# Altium footprint library mobinbyn-Module.PcbLib: 93 footprints (part 5 of 6)
Each footprint in its own frame and in the unit in brackets; x right, y up, seen from the top. Pads: shape width x height; smd on the part's side, far side on the other; paste and mask are expansions set on the pad; w line width, h text height; cw(c..) or ccw(c..) is an arc to the next point about the centre after c.
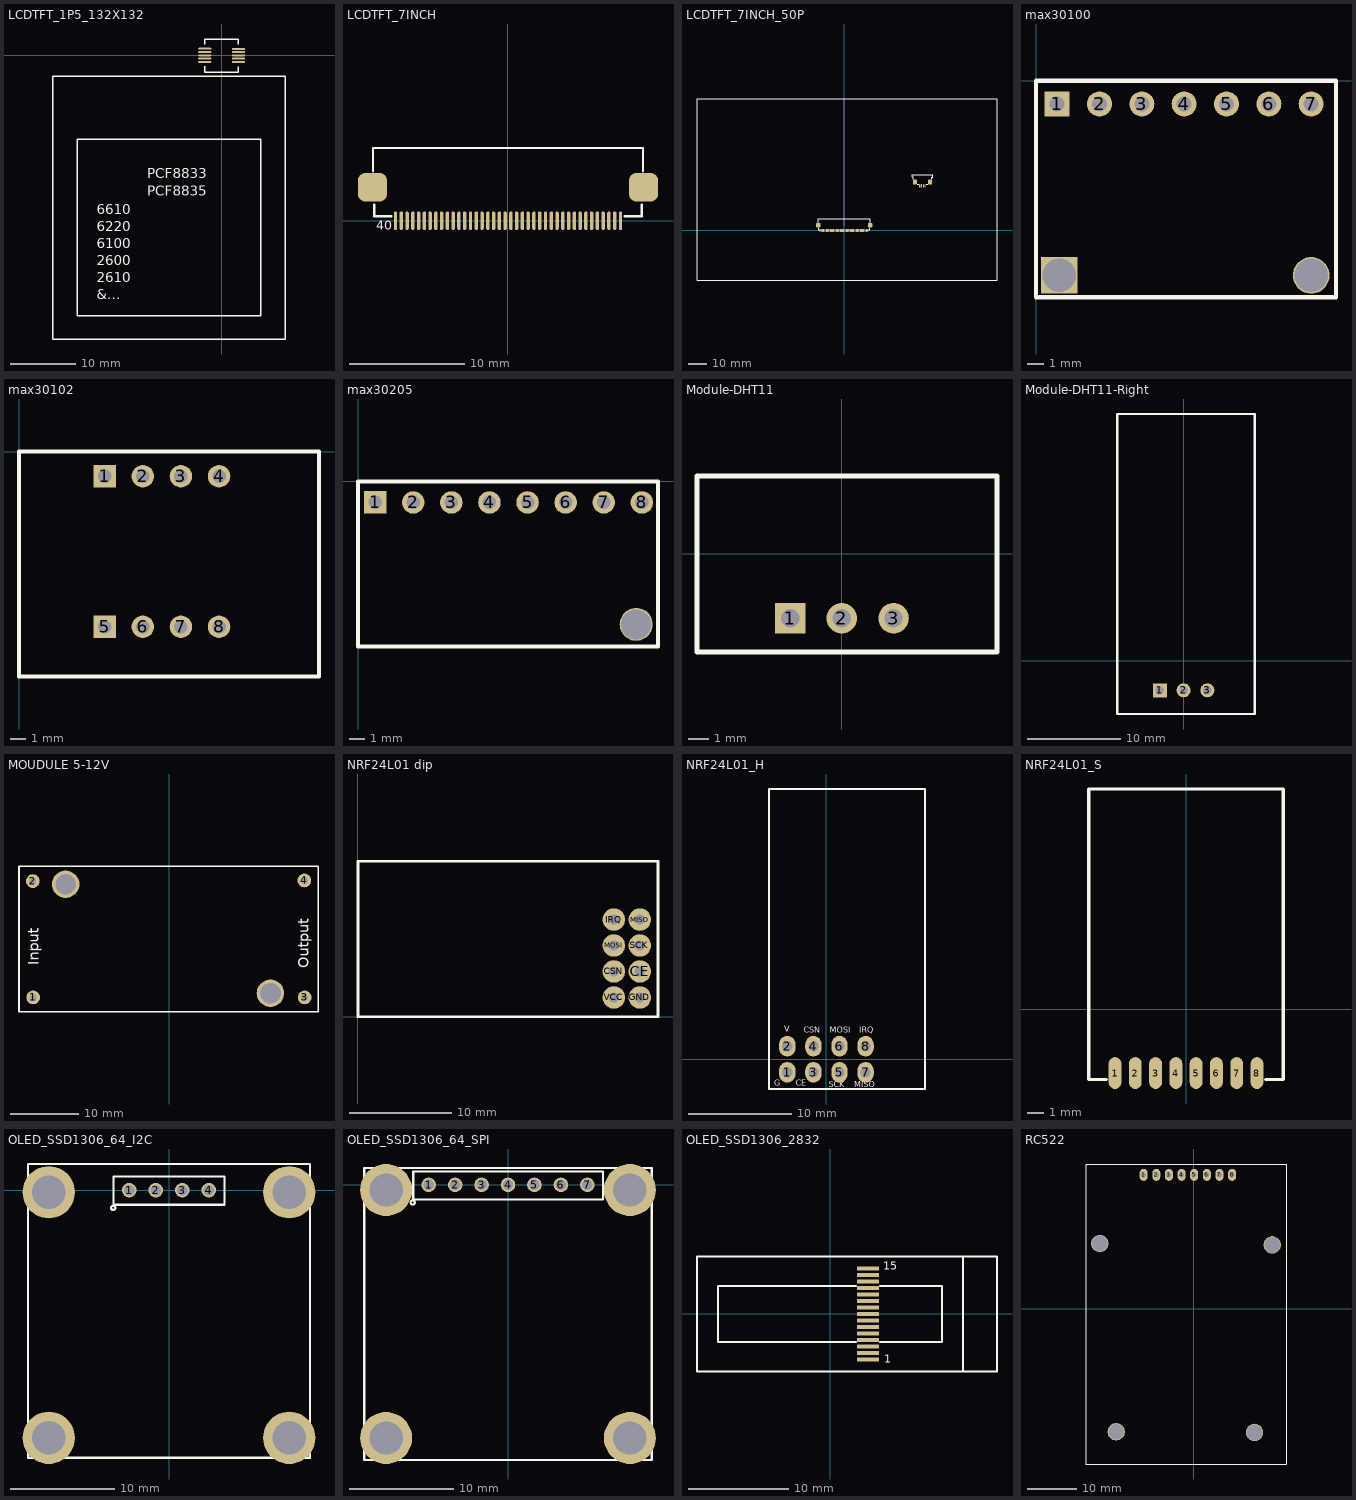
[diagram p4: the footprints below, top view; thin cyan lines are the x and y axes]

## LCDTFT_1P5_132X132 [mm] "LCD, NOKIA 6610, 6220, 6100, 2600, 2610"
height 2
pads (10):
  oval 2x0.3 smd mask+0.05: 1(-2.567,1.004) 2(-2.567,0.504) 3(-2.567,0.004) 4(-2.567,-0.496) 5(-2.567,-0.996) 6(2.567,-1.004) 7(2.567,-0.504) 8(2.567,-0.004) 9(2.567,0.496) 10(2.567,0.996)
Top Overlay:
  lines w0.2: -2.572,-2.587 -2.572,-1.697 ; -2.565,-2.591 2.515,-2.591 ; -2.565,2.489 2.515,2.489 ; -2.562,1.693 -2.562,2.483 ; 2.134,-12.827 2.388,-12.827 ; 2.518,1.693 2.518,2.473 ; 2.528,-2.587 2.528,-1.717 ; 2.388,-12.827 5.944,-12.827 5.944,-39.751 -21.996,-39.751 -21.996,-12.827 2.388,-12.827 ; -25.806,-43.307 9.754,-43.307 9.754,-3.175 -25.806,-3.175 -25.806,-43.307
  text "PCF8835" at -11.328,-21.463 h1.5
  text "&..." at -19.081,-37.211 h1.5
  text "2610" at -19.081,-34.62 h1.5
  text "2600" at -19.081,-32.029 h1.5
  text "6100" at -19.081,-29.439 h1.5
  text "6610" at -19.081,-24.257 h1.5
  text "6220" at -19.081,-26.848 h1.5
  text "PCF8833" at -11.328,-18.798 h1.5
3D body "DF23C-10DS-0.5V.stp": height 1.46, standoff 0.01, extent -3,-2.55 3,2.55
3D body: height 2, standoff 0, extent -25.819,-43.323 9.741,-3.191

## LCDTFT_7INCH [mm] "LCD, TFT, 7\" 800X480"
height 3
pads (42):
  oval 0.3x1.6 smd mask+0.05: 1(9.75,0) 2(9.25,0) 3(8.75,0) 4(8.25,0) 5(7.75,0) 6(7.25,0) 7(6.75,0) 8(6.25,0) 9(5.75,0) 10(5.25,0) 11(4.75,0) 12(4.25,0) 13(3.75,0) 14(3.25,0) 15(2.75,0) 16(2.25,0) 17(1.75,0) 18(1.25,0) 19(0.75,0) 20(0.25,0) 21(-0.25,0) 22(-0.75,0) 23(-1.25,0) 24(-1.75,0) 25(-2.25,0) 26(-2.75,0) 27(-3.25,0) 28(-3.75,0) 29(-4.25,0) 30(-4.75,0) 31(-5.25,0) 32(-5.75,0) 33(-6.25,0) 34(-6.75,0) 35(-7.25,0) 36(-7.75,0) 37(-8.25,0) 38(-8.75,0) 39(-9.25,0) 40(-9.75,0)
  rrect50% 2.5x2.5 smd: ""(-11.75,2.9) ""(11.75,2.9)
Top Overlay:
  lines w0.2: -11.7,4.3 -11.7,6.3 11.7,6.3 11.7,4.3 ; -11.6,1.4 -11.6,0.4 -10.1,0.4 ; 10.1,0.4 11.6,0.4 11.6,1.4
  text "40" at -11.4,-0.8 h0.8
3D body "FH12-40S-0.5SH.stp": height 2.09, standoff -0.01, extent -12.05,-0.3 12.05,6.1

## LCDTFT_7INCH_50P [mm] "LCD, TFT, 7\" 800X480"
height 3
pads (58):
  oval 0.3x1.6 smd mask+0.05: 1(12.25,0) 2(11.75,0) 3(11.25,0) 4(10.75,0) 5(10.25,0) 6(9.75,0) 7(9.25,0) 8(8.75,0) 9(8.25,0) 10(7.75,0) 11(7.25,0) 12(6.75,0) 13(6.25,0) 14(5.75,0) 15(5.25,0) 16(4.75,0) 17(4.25,0) 18(3.75,0) 19(3.25,0) 20(2.75,0) 21(2.25,0) 22(1.75,0) 23(1.25,0) 24(0.75,0) 25(0.25,0) 26(-0.25,0) 27(-0.75,0) 28(-1.25,0) 29(-1.75,0) 30(-2.25,0) 31(-2.75,0) 32(-3.25,0) 33(-3.75,0) 34(-4.25,0) 35(-4.75,0) 36(-5.25,0) 37(-5.75,0) 38(-6.25,0) 39(-6.75,0) 40(-7.25,0) 41(-7.75,0) 42(-8.25,0) 43(-8.75,0) 44(-9.25,0) 45(-9.75,0) 46(-10.25,0) 47(-10.75,0) 48(-11.25,0) 49(-11.75,0) 50(-12.25,0)
  rrect50% 2.5x2.5 smd: ""(-14.25,2.9) ""(14.25,2.9)
  rrect50% 2.3x2.8 smd: ""(38.85,26.56) ""(47.15,26.56)
  oval 0.6x1.8 smd: ""(41.5,24.46) ""(42.5,24.46) ""(43.5,24.46) ""(44.5,24.46)
Top Overlay:
  circle w0.2: c12.8,-0.1 r0.2
  lines w0.2: -14.2,4.3 -14.2,6.3 14.2,6.3 14.2,4.3 ; -14.1,1.4 -14.1,0.4 -12.6,0.4 ; 12.6,0.4 14.1,0.4 14.1,1.4 ; 38,28.11 38,29.41 37.4,29.41 37.4,30.71 48.6,30.71 48.6,29.31 48,29.31 48,28.11 ; 40,25.26 41,25.26 ; 45,25.26 46,25.26 ; -81,-27.51 -81,72.49 84,72.49 84,-27.51 -81,-27.51
  text "50" at -13.9,-0.8 h0.8
Bottom Overlay:
  lines w0.2: -26,70.99 -26,72.99 ; -12.5,2.49 12.5,2.49 ; 0,1.49 0,3.49 ; 42,24.49 44,24.49 ; 43,23.49 43,25.49 ; 54,70.99 54,72.99 ; -81,-27.51 84,-27.51 84,72.49 -81,72.49 -81,-27.51
Mechanical 1:
  lines w0.2: 0,2.49 0,72.49
3D body "2005290040.stp": height 1.93, standoff -0.03, extent 38,24.21 48,29.51
3D body "FH12-50S-0.5SH.stp": height 2.09, standoff -0.01, extent -14.55,-0.3 14.55,6.1

## max30100 [mm]
pads (9):
  rect 1.5x1.5 hole 0.9: 1(1.27,-1.397)
  round 1.5 hole 0.9: 2(3.81,-1.397) 3(6.35,-1.397) 4(8.89,-1.397) 5(11.43,-1.397) 6(13.97,-1.397) 7(16.51,-1.397)
  rect 2.2x2.2 hole 2: ""(1.397,-11.684)
  round 2.2 hole 2: ""(16.51,-11.684)
Top Overlay:
  lines w0.254: 0,-13 18,-13 18,0 0,0 0,-13
3D body "header 7.STEP": height 8.51, standoff -3.68, extent 0.211,-2.74 17.981,-0.211

## max30102 [mm]
pads (8):
  rect 1.5x1.5 hole 0.9: 1(5.715,-1.651) 5(5.715,-11.684)
  round 1.5 hole 0.9: 2(8.255,-1.651) 3(10.795,-1.651) 4(13.335,-1.651) 6(8.255,-11.684) 7(10.795,-11.684) 8(13.335,-11.684)
Top Overlay:
  lines w0.254: 0,-15 0,0 20,0 20,-15 0,-15
3D body "header 4.STEP": height 8.51, standoff -3.68, extent 4.455,-12.954 14.605,-10.424
3D body "header 4.STEP": height 8.51, standoff -3.68, extent 4.455,-2.921 14.605,-0.391

## max30205 [mm]
pads (9):
  rect 1.5x1.5 hole 0.9: 1(1.143,-1.397)
  round 1.5 hole 0.9: 2(3.683,-1.397) 3(6.223,-1.397) 4(8.763,-1.397) 5(11.303,-1.397) 6(13.843,-1.397) 7(16.383,-1.397) 8(18.923,-1.397)
  round 2.2 hole 2: ""(18.542,-9.525)
Top Overlay:
  lines w0.254: 0,-11 20,-11 20,0 0,0 0,-11
3D body "header 8.STEP": height 8.51, standoff -3.68, extent -0.117,-2.667 20.193,-0.137

## Module-DHT11 [mm]
pads (3):
  rect 1.5x1.5 hole 0.9: 1(-2.54,-3.175)
  round 1.5 hole 0.9: 2(0,-3.175) 3(2.54,-3.175)
Top Overlay:
  lines w0.254: -7.112,-4.826 7.62,-4.826 7.62,3.81 -7.112,3.81 -7.112,-4.826
3D body "Module-DHT11.step": height 31.75, standoff -5.33, extent -6.996,-4.767 7.504,3.753

## Module-DHT11-Right [mm]
pads (3):
  rect 1.5x1.5 hole 0.9: 1(-2.54,-3.175)
  round 1.5 hole 0.9: 2(0,-3.175) 3(2.54,-3.175)
Top Overlay:
  lines w0.254: -7.112,-5.715 7.62,-5.715 7.62,26.416 -7.112,26.416 -7.112,-5.715
3D body "Module-DHT11.step": height 7.91, standoff -0.61, extent -6.996,-10.789 7.504,26.291

## MOUDULE 5-12V [mm]
pads (6):
  round 2 hole 1: 1(-19.761,-32.893) 2(-19.812,-15.977) 3(19.736,-32.893) 4(19.685,-15.875)
  round 4 hole 3: ""(-15.037,-16.434) ""(14.757,-32.283)
Top Overlay:
  lines w0.254: -21.819,-34.976 21.692,-34.976 21.692,-13.818 -21.819,-13.818 -21.819,-34.976
  text "Output" at 20.295,-28.651 h1.52
  text "Input" at -18.923,-28.245 h1.52
3D body "User Library-DC-DC MODULE LM2596s.STEP": height 13.91, standoff 0.1, extent -21.801,-34.884 21.699,-13.884

## NRF24L01 dip [mm]
pads (8):
  round 2.2 hole 1: CE(27.559,4.445) CSN(25.019,4.445) GND(27.559,1.905) IRQ(25.019,9.525) MISO(27.559,9.525) MOSI(25.019,6.985) SCK(27.559,6.985) VCC(25.019,1.905)
Top Overlay:
  lines w0.254: 0,0 29.337,0 29.337,15.24 0,15.24 0,13.383 0,11.493 0,0
3D body "NRF24L01P.STEP": height 14.91, standoff 0, extent 0.083,0.247 29.083,15.247

## NRF24L01_H [mm] "MODULE, WIRELESS, NRF24L01 HEADER 2X8"
pads (8):
  oval 1.6x2 hole 1: 1(-3.81,-1.27) 2(-3.81,1.27) 3(-1.27,-1.27) 4(-1.27,1.27) 5(1.27,-1.27) 6(1.27,1.27) 7(3.81,-1.27) 8(3.81,1.27)
Top Overlay:
  lines w0.2: -5.6,-2.9 9.6,-2.9 9.6,26.3 -5.6,26.3 -5.6,-2.9
  text "V" at -4.1,2.5 h1
  text "G" at -5.1,-2.8 h1
  text "CSN" at -2.2,2.4 h1
  text "CE" at -3,-2.8 h1
  text "SCK" at 0.2,-2.9 h1
  text "MISO" at 2.7,-2.9 h1
  text "MOSI" at 0.3,2.4 h1
  text "IRQ" at 3.2,2.4 h1
3D body "NRF24L01P.STEP": height 14.93, standoff 0.02, extent -5.468,-2.794 9.532,26.206

## NRF24L01_S [mm] "MODULE, WIRELESS, NRF24L01+ smd Module"
pads (8):
  oval 0.8x2 smd: 1(-4.445,-4) 2(-3.175,-4) 3(-1.905,-4) 4(-0.635,-4) 5(0.635,-4) 6(1.905,-4) 7(3.175,-4) 8(4.445,-4)
Top Overlay:
  lines w0.2: -5,-4.4 -6.1,-4.4 -6.1,13.8 6.1,13.8 6.1,-4.4 5,-4.4
3D body "NRF24L01+ smd Module.step": height 0.8, standoff 0, extent -6,-4.3 6,13.7

## OLED_SSD1306_64_I2C [mm] "OLED SS1306 Breakout, 128X64, I2C"
height 10
pads (8):
  round 1.4 / inner round 1.4 / far side oval 1.4x2.2 hole 1 mask+0.1: 1(-3.81,0) 2(-1.27,0) 3(1.27,0) 4(3.81,0)
  round 5 hole 3.2: ""(-11.5,-23.7) ""(-11.5,-0.2) ""(11.5,-23.7) ""(11.5,-0.2)
Top Overlay:
  circle w0.2: c-5.34,-1.7 r0.2
  lines w0.2: -13.5,-25.6 -13.5,2.5 13.5,2.5 13.5,-25.6 -13.5,-25.6 ; -5.3,-1.4 5.3,-1.4 5.3,1.3 -5.3,1.3 -5.3,-1.4
3D body "User Library-128x64I2COLEDDisplayAdafruit_SSD1306.step": height 13.97, standoff 3.13, extent -13.35,-25.5 13.35,2.36
3D body "female_header_a-bl254-eg-g02d.stp": height 8.5, standoff -3.2, extent -0.125,-1.3 5.205,1.2
3D body "female_header_a-bl254-eg-g02d.stp": height 8.5, standoff -3.2, extent -5.205,-1.3 0.125,1.2

## OLED_SSD1306_64_SPI [mm] "OLED SS1306 Breakout, 128X64, SPI"
height 10
pads (11):
  round 1.4 / inner round 1.4 / far side oval 1.4x2.2 hole 1 mask+0.1: 1(-7.62,0) 2(-5.08,0) 3(-2.54,0) 4(0,0) 5(2.54,0) 6(5.08,0) 7(7.62,0)
  round 5 hole 3.2: ""(-11.702,-24.3) ""(-11.702,-0.5) ""(11.698,-24.3) ""(11.698,-0.5)
Top Overlay:
  circle w0.2: c-9.15,-1.7 r0.2
  lines w0.2: -13.8,-26.4 13.8,-26.4 13.8,1.6 -13.8,1.6 -13.8,-26.4 ; -9.1,-1.4 9.1,-1.4 9.1,1.3 -9.1,1.3 -9.1,-1.4
3D body "female_header_a-bl254-eg-g02d.stp": height 8.5, standoff -3.2, extent -1.395,-1.3 3.935,1.2
3D body "female_header_a-bl254-eg-g03d.stp": height 8.5, standoff -3.2, extent -9.015,-1.3 -1.145,1.2
3D body "female_header_a-bl254-eg-g02d.stp": height 8.5, standoff -3.2, extent 3.685,-1.3 9.015,1.2
3D body "OLED128X64SPI.step": height 13.92, standoff 2.37, extent -13.7,-26.3 13.7,1.5

## OLED_SSD1306_2832 [mm] "OLED Display UG-2832HSWEG04"
height 10
pads (15):
  rect 2.2x0.43 smd: 1(3.802,-4.55) 2(3.802,-3.9) 3(3.802,-3.25) 4(3.802,-2.6) 5(3.802,-1.95) 6(3.802,-1.3) 7(3.802,-0.65) 8(3.802,0) 9(3.802,0.65) 10(3.802,1.3) 11(3.802,1.95) 12(3.802,2.6) 13(3.802,3.25) 14(3.802,3.9) 15(3.802,4.55)
Top Overlay:
  lines w0.2: 2.6,-2.8 -11.2,-2.8 -11.2,2.8 2.6,2.8 ; 5,-2.8 11.2,-2.8 11.2,2.8 5,2.8 ; 13.3,-5.75 13.3,5.75 ; -13.3,-5.75 16.7,-5.75 16.7,5.75 -13.3,5.75 -13.3,-5.75
  text "15" at 5.3,4.4 h0.8
  text "1" at 5.4,-4.9 h0.8
3D body "0.91in OLED - Folded - Without Glass.stp": height 3.51, standoff 1.22, extent -13.451,-5.605 21.451,5.9

## RC522 [mm] "RFID RC522"
pads (12):
  oval 1.6x2.4 hole 1: 1(-10.1,26.9) 2(-7.56,26.9) 3(-5.02,26.9) 4(-2.48,26.9) 5(0.06,26.9) 6(2.6,26.9) 7(5.14,26.9) 8(7.68,26.9)
  round 3.5 / inner round 3.5 / far side round 5.5 hole 3.2: ""(-18.923,13.081) ""(-15.621,-24.765) ""(12.192,-24.892) ""(15.748,12.827)
Top Overlay:
  lines w0.2: -21.717,-31.242 -21.717,29.083 18.542,29.083 18.542,-31.242 -21.717,-31.242
3D body "RC522.STEP": height 7.32, standoff -4.22, extent -21.651,-30.917 18.349,29.083